# Altium footprint library Pin Header WR-PHD_2.54mm.PcbLib: 138 footprints (part 1 of 9)
Each footprint in its own frame and in the unit in brackets; x right, y up, seen from the top. Pads: shape width x height; smd on the part's side, far side on the other; paste and mask are expansions set on the pad; w line width, h text height; cw(c..) or ccw(c..) is an arc to the next point about the centre after c.
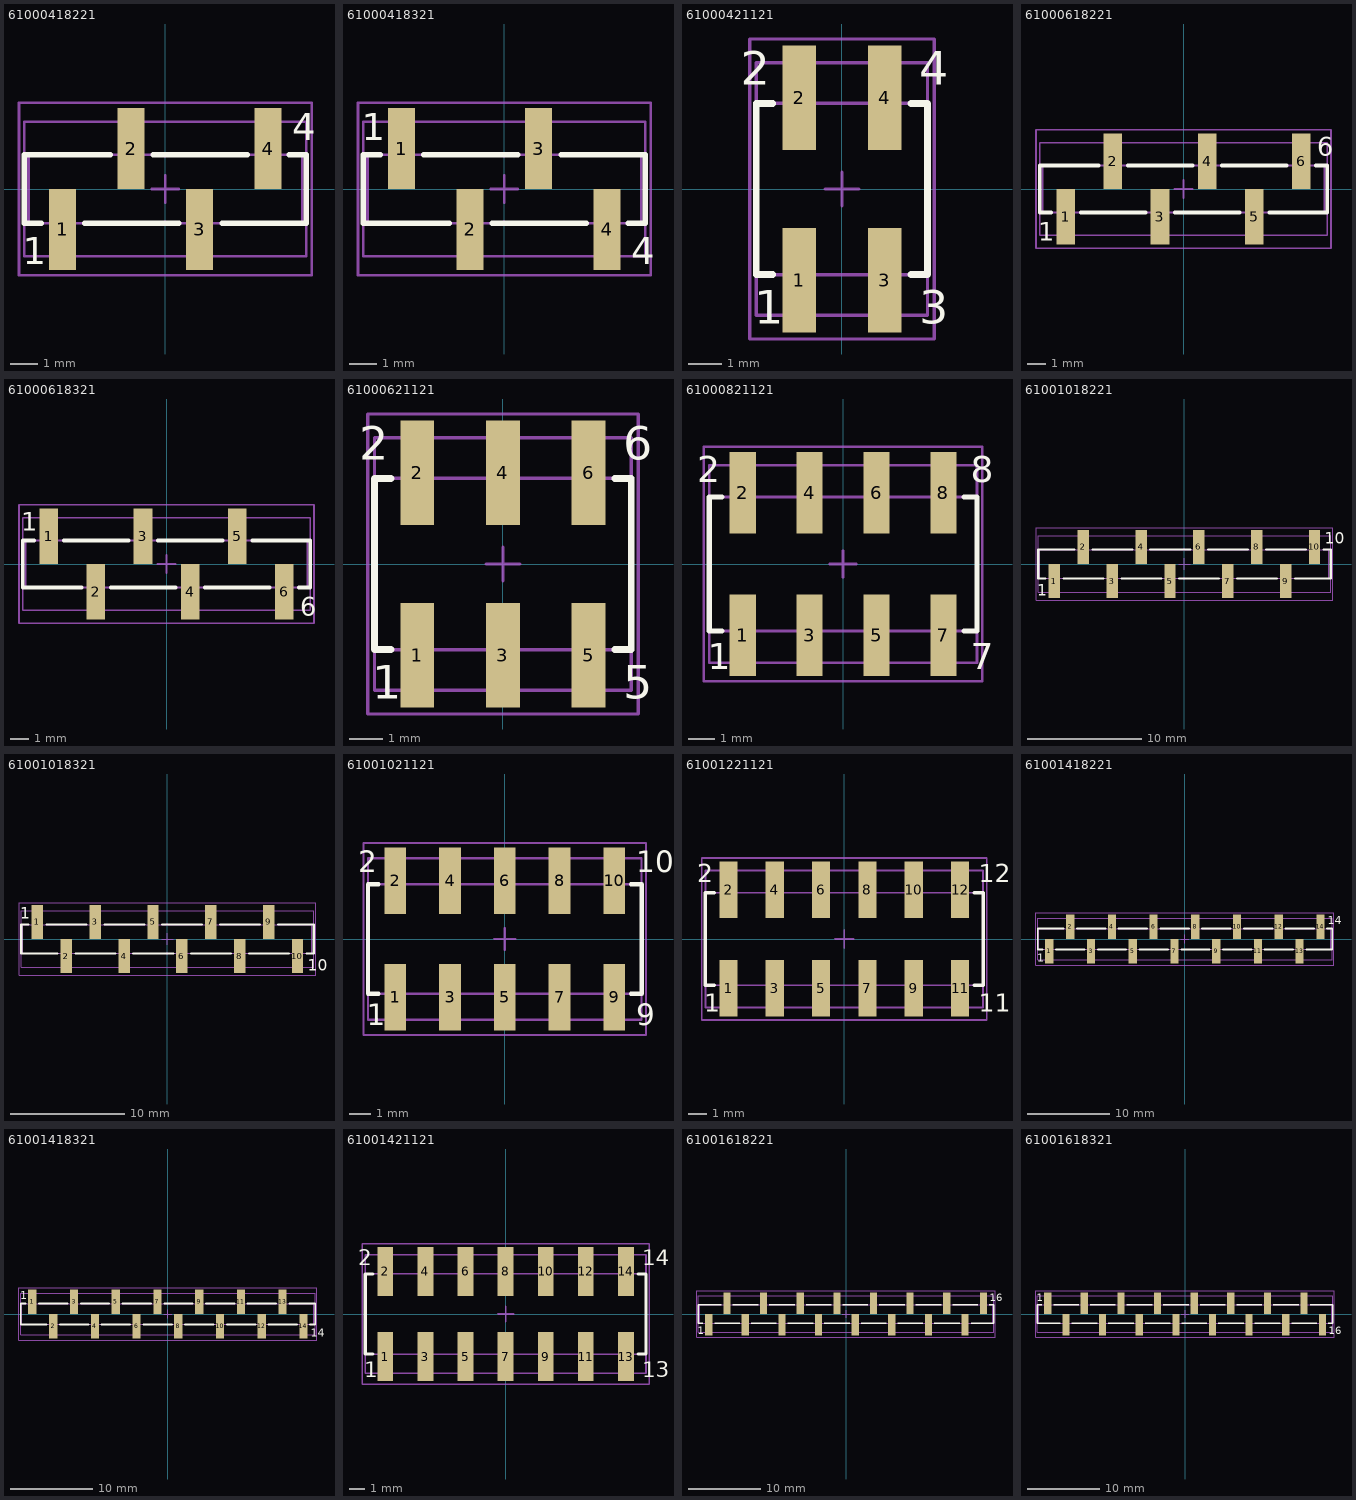
[diagram p0: the footprints below, top view; thin cyan lines are the x and y axes]

## 61000418221 [mm] "Pin Header, pitch 2.54 mm, SMD, Vertical, single row, 4p"
height 9.3
pads (4):
  rect 1x3 smd: 1(-3.81,-1.5) 2(-1.27,1.5) 3(1.27,-1.5) 4(3.81,1.5)
Top Overlay:
  lines w0.2: -4.6,-1.27 -5.23,-1.27 -5.23,1.27 -2.05,1.27 ; -3,-1.27 0.5,-1.27 ; -0.46,1.27 3.04,1.27 ; 2.1,-1.27 5.23,-1.27 5.23,1.27 4.6,1.27
  text "4" at 4.7,1.8 h1
  text "1" at -5.3,-2.8 h1
Mechanical 11:
  lines w0.1: -5.08,-1.27 -5.08,1.27 5.08,1.27 5.08,-1.27 -5.08,-1.27
Mechanical 13:
  lines w0.1: -5.23,-2.5 5.23,-2.5 5.23,2.5 -5.23,2.5 -5.23,-2.5
Mechanical 15:
  lines w0.1: -0.5,0 0.5,0 ; 0,-0.5 0,0.5 ; -5.43,-3.2 5.43,-3.2 5.43,3.2 -5.43,3.2 -5.43,-3.2
3D body "61000418221.stp": height 9.33, standoff 0, extent -5.08,-2.5 5.08,2.5

## 61000418321 [mm] "Pin Header, pitch 2.54 mm, SMD, Vertical, single row, 4p"
height 9.3
pads (4):
  rect 1x3 smd: 1(-3.81,1.5) 2(-1.27,-1.5) 3(1.27,1.5) 4(3.81,-1.5)
Top Overlay:
  lines w0.2: -4.6,1.27 -5.23,1.27 -5.23,-1.27 -2.05,-1.27 ; -3,1.27 0.5,1.27 ; -0.46,-1.27 3.04,-1.27 ; 2.1,1.27 5.23,1.27 5.23,-1.27 4.6,-1.27
  text "4" at 4.7,-2.8 h1
  text "1" at -5.3,1.8 h1
Mechanical 11:
  lines w0.1: -5.08,-1.27 -5.08,1.27 5.08,1.27 5.08,-1.27 -5.08,-1.27
Mechanical 13:
  lines w0.1: -5.23,-2.5 5.23,-2.5 5.23,2.5 -5.23,2.5 -5.23,-2.5
Mechanical 15:
  lines w0.1: -0.5,0 0.5,0 ; 0,-0.5 0,0.5 ; -5.43,-3.2 5.43,-3.2 5.43,3.2 -5.43,3.2 -5.43,-3.2
3D body "61000418321.stp": height 9.37, standoff 0.04, extent -5.08,-2.5 5.08,2.5

## 61000421121 [mm] "Pin Header, pitch 2.54 mm, SMD, Vertical, dual row, 4p"
height 9.6
pads (4):
  rect 1x3.1 smd: 1(-1.27,-2.7) 2(-1.27,2.7) 3(1.27,-2.7) 4(1.27,2.7)
Top Overlay:
  lines w0.2: -2.05,-2.54 -2.54,-2.54 -2.54,2.54 -2.05,2.54 ; 2.05,-2.54 2.54,-2.54 2.54,2.54 2.05,2.54
  text "2" at -3,3.1 h1
  text "4" at 2.3,3.1 h1
  text "3" at 2.3,-4 h1
  text "1" at -2.6,-4 h1
Mechanical 11:
  lines w0.1: -2.54,-2.54 -2.54,2.54 2.54,2.54 2.54,-2.54 -2.54,-2.54
Mechanical 13:
  lines w0.1: -2.54,-3.75 2.54,-3.75 2.54,3.75 -2.54,3.75 -2.54,-3.75
Mechanical 15:
  lines w0.1: -0.5,0 0.5,0 ; 0,-0.5 0,0.5 ; -2.74,-4.45 2.74,-4.45 2.74,4.45 -2.74,4.45 -2.74,-4.45
3D body "61000421121.stp": height 9.62, standoff 0.02, extent -2.54,-3.75 2.54,3.75

## 61000618221 [mm] "Pin Header, pitch 2.54 mm, SMD, Vertical, single row, 6p"
height 9.3
pads (6):
  rect 1x3 smd: 1(-6.35,-1.5) 2(-3.81,1.5) 3(-1.27,-1.5) 4(1.27,1.5) 5(3.81,-1.5) 6(6.35,1.5)
Top Overlay:
  lines w0.2: -7.14,-1.27 -7.77,-1.27 -7.77,1.27 -4.59,1.27 ; -5.54,-1.27 -2.04,-1.27 ; -3,1.27 0.5,1.27 ; -0.46,-1.27 3.04,-1.27 ; 2.08,1.27 5.58,1.27 ; 4.64,-1.27 7.77,-1.27 7.77,1.27 7.14,1.27
  text "6" at 7.24,1.8 h1
  text "1" at -7.84,-2.8 h1
Mechanical 11:
  lines w0.1: -7.62,-1.27 7.62,-1.27 7.62,1.27 -7.62,1.27 -7.62,-1.27
Mechanical 13:
  lines w0.1: -7.77,-2.5 -7.77,2.5 7.77,2.5 7.77,-2.5 -7.77,-2.5
Mechanical 15:
  lines w0.1: -0.5,0 0.5,0 ; 0,-0.5 0,0.5 ; -7.97,-3.2 -7.97,3.2 7.97,3.2 7.97,-3.2 -7.97,-3.2
3D body "61000618221.stp": height 9.33, standoff 0, extent -7.62,-2.5 7.62,2.5

## 61000618321 [mm] "Pin Header, pitch 2.54 mm, SMD, Vertical, single row, 6p"
height 9.3
pads (6):
  rect 1x3 smd: 1(-6.35,1.5) 2(-3.81,-1.5) 3(-1.27,1.5) 4(1.27,-1.5) 5(3.81,1.5) 6(6.35,-1.5)
Top Overlay:
  lines w0.2: -7.14,1.27 -7.77,1.27 -7.77,-1.27 -4.59,-1.27 ; -5.54,1.27 -2.04,1.27 ; -3,-1.27 0.5,-1.27 ; -0.46,1.27 3.04,1.27 ; 2.08,-1.27 5.58,-1.27 ; 4.64,1.27 7.77,1.27 7.77,-1.27 7.14,-1.27
  text "1" at -7.84,1.8 h1
  text "6" at 7.24,-2.8 h1
Mechanical 11:
  lines w0.1: -7.62,-1.27 7.62,-1.27 7.62,1.27 -7.62,1.27 -7.62,-1.27
Mechanical 13:
  lines w0.1: -7.77,-2.5 -7.77,2.5 7.77,2.5 7.77,-2.5 -7.77,-2.5
Mechanical 15:
  lines w0.1: -0.5,0 0.5,0 ; 0,-0.5 0,0.5 ; -7.97,-3.2 -7.97,3.2 7.97,3.2 7.97,-3.2 -7.97,-3.2
3D body "61000618321.stp": height 9.37, standoff 0.04, extent -7.62,-2.5 7.62,2.5

## 61000621121 [mm] "Pin Header, pitch 2.54 mm, SMD, Vertical, dual row, 6p"
height 9.6
pads (6):
  rect 1x3.1 smd: 1(-2.54,-2.7) 2(-2.54,2.7) 3(0,-2.7) 4(0,2.7) 5(2.54,-2.7) 6(2.54,2.7)
Top Overlay:
  lines w0.2: -3.32,-2.54 -3.81,-2.54 -3.81,2.54 -3.32,2.54 ; 3.32,-2.54 3.81,-2.54 3.81,2.54 3.32,2.54
  text "2" at -4.27,3.1 h1
  text "1" at -3.87,-4 h1
  text "5" at 3.57,-4 h1
  text "6" at 3.57,3.1 h1
Mechanical 11:
  lines w0.1: -3.81,-2.54 -3.81,2.54 3.81,2.54 3.81,-2.54 -3.81,-2.54
Mechanical 13:
  lines w0.1: -3.81,-3.75 3.81,-3.75 3.81,3.75 -3.81,3.75 -3.81,-3.75
Mechanical 15:
  lines w0.1: -0.5,0 0.5,0 ; 0,-0.5 0,0.5 ; -4.01,-4.45 4.01,-4.45 4.01,4.45 -4.01,4.45 -4.01,-4.45
3D body "61000621121.stp": height 9.62, standoff 0.02, extent -3.81,-3.75 3.81,3.75

## 61000821121 [mm] "Pin Header, pitch 2.54 mm, SMD, Vertical, dual row, 8p"
height 9.6
pads (8):
  rect 1x3.1 smd: 1(-3.81,-2.7) 2(-3.81,2.7) 3(-1.27,-2.7) 4(-1.27,2.7) 5(1.27,-2.7) 6(1.27,2.7) 7(3.81,-2.7) 8(3.81,2.7)
Top Overlay:
  lines w0.2: -4.59,-2.54 -5.08,-2.54 -5.08,2.54 -4.59,2.54 ; 4.59,-2.54 5.08,-2.54 5.08,2.54 4.59,2.54
  text "2" at -5.54,3.1 h1
  text "1" at -5.14,-4 h1
  text "7" at 4.84,-4 h1
  text "8" at 4.84,3.1 h1
Mechanical 11:
  lines w0.1: -5.08,-2.54 -5.08,2.54 5.08,2.54 5.08,-2.54 -5.08,-2.54
Mechanical 13:
  lines w0.1: -5.08,-3.75 5.08,-3.75 5.08,3.75 -5.08,3.75 -5.08,-3.75
Mechanical 15:
  lines w0.1: -0.5,0 0.5,0 ; 0,-0.5 0,0.5 ; -5.28,-4.45 5.28,-4.45 5.28,4.45 -5.28,4.45 -5.28,-4.45
3D body "61000821121.stp": height 9.62, standoff 0.02, extent -5.08,-3.75 5.08,3.75

## 61001018221 [mm] "Pin Header, pitch 2.54 mm, SMD, Vertical, single row, 10p"
height 9.3
pads (10):
  rect 1x3 smd: 1(-11.43,-1.5) 2(-8.89,1.5) 3(-6.35,-1.5) 4(-3.81,1.5) 5(-1.27,-1.5) 6(1.27,1.5) 7(3.81,-1.5) 8(6.35,1.5) 9(8.89,-1.5) 10(11.43,1.5)
Top Overlay:
  lines w0.2: -12.22,-1.27 -12.85,-1.27 -12.85,1.27 -9.67,1.27 ; -10.62,-1.27 -7.12,-1.27 ; -8.08,1.27 -4.58,1.27 ; -5.54,-1.27 -2.04,-1.27 ; -3,1.27 0.5,1.27 ; -0.46,-1.27 3.04,-1.27 ; 2.08,1.27 5.58,1.27 ; 4.62,-1.27 8.12,-1.27 ; 7.16,1.27 10.66,1.27 ; 9.72,-1.27 12.85,-1.27 12.85,1.27 12.22,1.27
  text "10" at 12.32,1.8 h1
  text "1" at -12.92,-2.8 h1
Mechanical 11:
  lines w0.1: -12.7,-1.27 -12.7,1.27 12.7,1.27 12.7,-1.27 -12.7,-1.27
Mechanical 13:
  lines w0.1: -12.85,-2.5 12.85,-2.5 12.85,2.5 -12.85,2.5 -12.85,-2.5
Mechanical 15:
  lines w0.1: -0.5,0 0.5,0 ; 0,-0.5 0,0.5 ; -13.05,-3.2 13.05,-3.2 13.05,3.2 -13.05,3.2 -13.05,-3.2
3D body "61001018221.stp": height 9.33, standoff 0, extent -12.7,-2.5 12.7,2.5

## 61001018321 [mm] "Pin Header, pitch 2.54 mm, SMD, Vertical, single row, 8p"
height 9.3
pads (10):
  rect 1x3 smd: 1(-11.43,1.5) 2(-8.89,-1.5) 3(-6.35,1.5) 4(-3.81,-1.5) 5(-1.27,1.5) 6(1.27,-1.5) 7(3.81,1.5) 8(6.35,-1.5) 9(8.89,1.5) 10(11.43,-1.5)
Top Overlay:
  lines w0.2: -12.22,1.27 -12.85,1.27 -12.85,-1.27 -9.67,-1.27 ; -10.62,1.27 -7.12,1.27 ; -8.08,-1.27 -4.58,-1.27 ; -5.54,1.27 -2.04,1.27 ; -3,-1.27 0.5,-1.27 ; -0.46,1.27 3.04,1.27 ; 2.08,-1.27 5.58,-1.27 ; 4.62,1.27 8.12,1.27 ; 7.16,-1.27 10.66,-1.27 ; 9.72,1.27 12.85,1.27 12.85,-1.27 12.22,-1.27
  text "10" at 12.32,-2.8 h1
  text "1" at -12.92,1.8 h1
Mechanical 11:
  lines w0.1: -12.7,-1.27 12.7,-1.27 12.7,1.27 -12.7,1.27 -12.7,-1.27
Mechanical 13:
  lines w0.1: -12.85,-2.5 -12.85,2.5 12.85,2.5 12.85,-2.5 -12.85,-2.5
Mechanical 15:
  lines w0.1: -0.5,0 0.5,0 ; 0,-0.5 0,0.5 ; -13.05,-3.2 -13.05,3.2 13.05,3.2 13.05,-3.2 -13.05,-3.2
3D body "61001018321.stp": height 9.37, standoff 0.04, extent -12.7,-2.5 12.7,2.5

## 61001021121 [mm] "Pin Header, pitch 2.54 mm, SMD, Vertical, dual row, 10p"
height 9.6
pads (10):
  rect 1x3.1 smd: 1(-5.08,-2.7) 2(-5.08,2.7) 3(-2.54,-2.7) 4(-2.54,2.7) 5(0,-2.7) 6(0,2.7) 7(2.54,-2.7) 8(2.54,2.7) 9(5.08,-2.7) 10(5.08,2.7)
Top Overlay:
  lines w0.2: -5.86,-2.54 -6.35,-2.54 -6.35,2.54 -5.86,2.54 ; 5.86,-2.54 6.35,-2.54 6.35,2.54 5.86,2.54
  text "2" at -6.81,3.1 h1
  text "1" at -6.41,-4 h1
  text "9" at 6.11,-4 h1
  text "10" at 6.11,3.1 h1
Mechanical 11:
  lines w0.1: -6.35,-2.54 -6.35,2.54 6.35,2.54 6.35,-2.54 -6.35,-2.54
Mechanical 13:
  lines w0.1: -6.35,-3.75 6.35,-3.75 6.35,3.75 -6.35,3.75 -6.35,-3.75
Mechanical 15:
  lines w0.1: -0.5,0 0.5,0 ; 0,-0.5 0,0.5 ; -6.55,-4.45 6.55,-4.45 6.55,4.45 -6.55,4.45 -6.55,-4.45
3D body "61001021121.stp": height 9.62, standoff 0.02, extent -6.35,-3.75 6.35,3.75

## 61001221121 [mm] "Pin Header, pitch 2.54 mm, SMD, Vertical, dual row, 12p"
height 9.6
pads (12):
  rect 1x3.1 smd: 1(-6.35,-2.7) 2(-6.35,2.7) 3(-3.81,-2.7) 4(-3.81,2.7) 5(-1.27,-2.7) 6(-1.27,2.7) 7(1.27,-2.7) 8(1.27,2.7) 9(3.81,-2.7) 10(3.81,2.7) 11(6.35,-2.7) 12(6.35,2.7)
Top Overlay:
  lines w0.2: -7.13,-2.54 -7.62,-2.54 -7.62,2.54 -7.13,2.54 ; 7.13,-2.54 7.62,-2.54 7.62,2.54 7.13,2.54
  text "2" at -8.08,3.1 h1
  text "1" at -7.68,-4 h1
  text "11" at 7.38,-4 h1
  text "12" at 7.38,3.1 h1
Mechanical 11:
  lines w0.1: -7.62,-2.54 -7.62,2.54 7.62,2.54 7.62,-2.54 -7.62,-2.54
Mechanical 13:
  lines w0.1: -7.62,-3.75 7.62,-3.75 7.62,3.75 -7.62,3.75 -7.62,-3.75
Mechanical 15:
  lines w0.1: -0.5,0 0.5,0 ; 0,-0.5 0,0.5 ; -7.82,-4.45 7.82,-4.45 7.82,4.45 -7.82,4.45 -7.82,-4.45
3D body "61001221121.stp": height 9.62, standoff 0.02, extent -7.62,-3.75 7.62,3.75

## 61001418221 [mm] "Pin Header, pitch 2.54 mm, SMD, Vertical, single row, 14p"
height 9.3
pads (14):
  rect 1x3 smd: 1(-16.51,-1.5) 2(-13.97,1.5) 3(-11.43,-1.5) 4(-8.89,1.5) 5(-6.35,-1.5) 6(-3.81,1.5) 7(-1.27,-1.5) 8(1.27,1.5) 9(3.81,-1.5) 10(6.35,1.5) 11(8.89,-1.5) 12(11.43,1.5) 13(13.97,-1.5) 14(16.51,1.5)
Top Overlay:
  lines w0.2: -17.3,-1.27 -17.93,-1.27 -17.93,1.27 -14.75,1.27 ; -15.7,-1.27 -12.2,-1.27 ; -13.16,1.27 -9.66,1.27 ; -10.62,-1.27 -7.12,-1.27 ; -8.08,1.27 -4.58,1.27 ; -5.54,-1.27 -2.04,-1.27 ; -3,1.27 0.5,1.27 ; -0.46,-1.27 3.04,-1.27 ; 2.08,1.27 5.58,1.27 ; 4.62,-1.27 8.12,-1.27 ; 7.16,1.27 10.66,1.27 ; 9.7,-1.27 13.2,-1.27 ; 12.24,1.27 15.74,1.27 ; 14.8,-1.27 17.93,-1.27 17.93,1.27 17.3,1.27
  text "14" at 17.4,1.8 h1
  text "1" at -18,-2.8 h1
Mechanical 11:
  lines w0.1: -17.78,-1.27 17.78,-1.27 17.78,1.27 -17.78,1.27 -17.78,-1.27
Mechanical 13:
  lines w0.1: -17.93,-2.5 -17.93,2.5 17.93,2.5 17.93,-2.5 -17.93,-2.5
Mechanical 15:
  lines w0.1: -0.5,0 0.5,0 ; 0,-0.5 0,0.5 ; -18.13,-3.2 -18.13,3.2 18.13,3.2 18.13,-3.2 -18.13,-3.2
3D body "61001418221.stp": height 9.33, standoff 0, extent -17.78,-2.5 17.78,2.5

## 61001418321 [mm] "Pin Header, pitch 2.54 mm, SMD, Vertical, single row, 14p"
height 9.3
pads (14):
  rect 1x3 smd: 1(-16.51,1.5) 2(-13.97,-1.5) 3(-11.43,1.5) 4(-8.89,-1.5) 5(-6.35,1.5) 6(-3.81,-1.5) 7(-1.27,1.5) 8(1.27,-1.5) 9(3.81,1.5) 10(6.35,-1.5) 11(8.89,1.5) 12(11.43,-1.5) 13(13.97,1.5) 14(16.51,-1.5)
Top Overlay:
  lines w0.2: -17.3,1.27 -17.93,1.27 -17.93,-1.27 -14.75,-1.27 ; -15.7,1.27 -12.2,1.27 ; -13.16,-1.27 -9.66,-1.27 ; -10.62,1.27 -7.12,1.27 ; -8.08,-1.27 -4.58,-1.27 ; -5.54,1.27 -2.04,1.27 ; -3,-1.27 0.5,-1.27 ; -0.46,1.27 3.04,1.27 ; 2.08,-1.27 5.58,-1.27 ; 4.62,1.27 8.12,1.27 ; 7.16,-1.27 10.66,-1.27 ; 9.7,1.27 13.2,1.27 ; 12.24,-1.27 15.74,-1.27 ; 14.8,1.27 17.93,1.27 17.93,-1.27 17.3,-1.27
  text "1" at -18,1.8 h1
  text "14" at 17.4,-2.8 h1
Mechanical 11:
  lines w0.1: -17.78,-1.27 17.78,-1.27 17.78,1.27 -17.78,1.27 -17.78,-1.27
Mechanical 13:
  lines w0.1: -17.93,-2.5 -17.93,2.5 17.93,2.5 17.93,-2.5 -17.93,-2.5
Mechanical 15:
  lines w0.1: -0.5,0 0.5,0 ; 0,-0.5 0,0.5 ; -18.13,-3.2 -18.13,3.2 18.13,3.2 18.13,-3.2 -18.13,-3.2
3D body "61001418321.stp": height 9.37, standoff 0.04, extent -17.78,-2.5 17.78,2.5

## 61001421121 [mm] "Pin Header, pitch 2.54 mm, SMD, Vertical, dual row, 14p"
height 9.6
pads (14):
  rect 1x3.1 smd: 1(-7.62,-2.7) 2(-7.62,2.7) 3(-5.08,-2.7) 4(-5.08,2.7) 5(-2.54,-2.7) 6(-2.54,2.7) 7(0,-2.7) 8(0,2.7) 9(2.54,-2.7) 10(2.54,2.7) 11(5.08,-2.7) 12(5.08,2.7) 13(7.62,-2.7) 14(7.62,2.7)
Top Overlay:
  lines w0.2: -8.4,-2.54 -8.89,-2.54 -8.89,2.54 -8.4,2.54 ; 8.4,-2.54 8.89,-2.54 8.89,2.54 8.4,2.54
  text "2" at -9.35,3.1 h1
  text "1" at -8.95,-4 h1
  text "13" at 8.65,-4 h1
  text "14" at 8.65,3.1 h1
Mechanical 11:
  lines w0.1: -8.89,-2.54 -8.89,2.54 8.89,2.54 8.89,-2.54 -8.89,-2.54
Mechanical 13:
  lines w0.1: -8.89,-3.75 8.89,-3.75 8.89,3.75 -8.89,3.75 -8.89,-3.75
Mechanical 15:
  lines w0.1: -0.5,0 0.5,0 ; 0,-0.5 0,0.5 ; -9.09,-4.45 9.09,-4.45 9.09,4.45 -9.09,4.45 -9.09,-4.45
3D body "61001421121.stp": height 9.62, standoff 0.02, extent -8.89,-3.75 8.89,3.75

## 61001618221 [mm] "Pin Header, pitch 2.54 mm, SMD, Vertical, single row, 16p"
height 9.3
pads (16):
  rect 1x3 smd: 1(-19.05,-1.5) 2(-16.51,1.5) 3(-13.97,-1.5) 4(-11.43,1.5) 5(-8.89,-1.5) 6(-6.35,1.5) 7(-3.81,-1.5) 8(-1.27,1.5) 9(1.27,-1.5) 10(3.81,1.5) 11(6.35,-1.5) 12(8.89,1.5) 13(11.43,-1.5) 14(13.97,1.5) 15(16.51,-1.5) 16(19.05,1.5)
Top Overlay:
  lines w0.2: -19.84,-1.27 -20.47,-1.27 -20.47,1.27 -17.29,1.27 ; -18.24,-1.27 -14.74,-1.27 ; -15.7,1.27 -12.2,1.27 ; -13.16,-1.27 -9.66,-1.27 ; -10.62,1.27 -7.12,1.27 ; -8.08,-1.27 -4.58,-1.27 ; -5.54,1.27 -2.04,1.27 ; -3,-1.27 0.5,-1.27 ; -0.46,1.27 3.04,1.27 ; 2.08,-1.27 5.58,-1.27 ; 4.62,1.27 8.12,1.27 ; 7.16,-1.27 10.66,-1.27 ; 9.7,1.27 13.2,1.27 ; 12.24,-1.27 15.74,-1.27 ; 14.78,1.27 18.28,1.27 ; 17.34,-1.27 20.47,-1.27 20.47,1.27 19.84,1.27
  text "16" at 19.94,1.8 h1
  text "1" at -20.54,-2.8 h1
Mechanical 11:
  lines w0.1: -20.32,-1.27 20.32,-1.27 20.32,1.27 -20.32,1.27 -20.32,-1.27
Mechanical 13:
  lines w0.1: -20.47,-2.5 -20.47,2.5 20.47,2.5 20.47,-2.5 -20.47,-2.5
Mechanical 15:
  lines w0.1: -0.5,0 0.5,0 ; 0,-0.5 0,0.5 ; -20.67,-3.2 -20.67,3.2 20.67,3.2 20.67,-3.2 -20.67,-3.2
3D body "61001618221.stp": height 9.33, standoff 0, extent -20.32,-2.5 20.32,2.5

## 61001618321 [mm] "Pin Header, pitch 2.54 mm, SMD, Vertical, single row, 16p"
height 9.3
pads (16):
  rect 1x3 smd: 1(-19.05,1.5) 2(-16.51,-1.5) 3(-13.97,1.5) 4(-11.43,-1.5) 5(-8.89,1.5) 6(-6.35,-1.5) 7(-3.81,1.5) 8(-1.27,-1.5) 9(1.27,1.5) 10(3.81,-1.5) 11(6.35,1.5) 12(8.89,-1.5) 13(11.43,1.5) 14(13.97,-1.5) 15(16.51,1.5) 16(19.05,-1.5)
Top Overlay:
  lines w0.2: -19.84,1.27 -20.47,1.27 -20.47,-1.27 -17.29,-1.27 ; -18.24,1.27 -14.74,1.27 ; -15.7,-1.27 -12.2,-1.27 ; -13.16,1.27 -9.66,1.27 ; -10.62,-1.27 -7.12,-1.27 ; -8.08,1.27 -4.58,1.27 ; -5.54,-1.27 -2.04,-1.27 ; -3,1.27 0.5,1.27 ; -0.46,-1.27 3.04,-1.27 ; 2.08,1.27 5.58,1.27 ; 4.62,-1.27 8.12,-1.27 ; 7.16,1.27 10.66,1.27 ; 9.7,-1.27 13.2,-1.27 ; 12.24,1.27 15.74,1.27 ; 14.78,-1.27 18.28,-1.27 ; 17.34,1.27 20.47,1.27 20.47,-1.27 19.84,-1.27
  text "16" at 19.94,-2.8 h1
  text "1" at -20.54,1.8 h1
Mechanical 11:
  lines w0.1: -20.32,-1.27 -20.32,1.27 20.32,1.27 20.32,-1.27 -20.32,-1.27
Mechanical 13:
  lines w0.1: -20.47,-2.5 20.47,-2.5 20.47,2.5 -20.47,2.5 -20.47,-2.5
Mechanical 15:
  lines w0.1: -0.5,0 0.5,0 ; 0,-0.5 0,0.5 ; -20.67,-3.2 20.67,-3.2 20.67,3.2 -20.67,3.2 -20.67,-3.2
3D body "61001618321.stp": height 9.37, standoff 0.04, extent -20.32,-2.5 20.32,2.5